# Altium schematic symbol library jlcpcb_2025_04_capacitors_extended_0402.schlib: 3594 symbols (part 20 of 20) (continued)
## V271K0402X7R500NBT (continued)
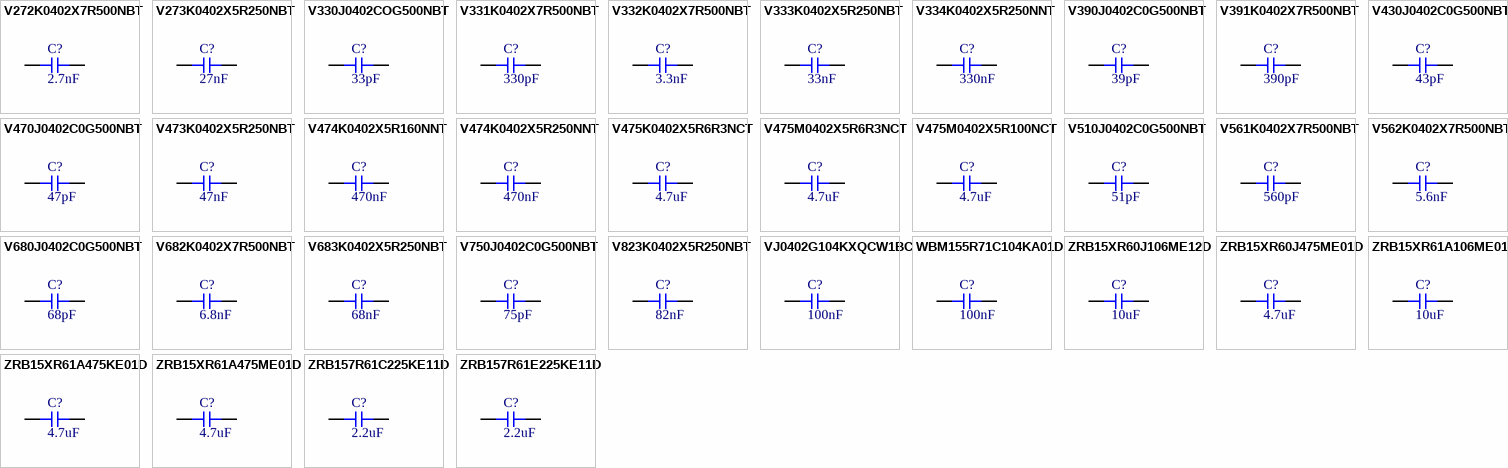
[diagram p89: symbols V272K0402X7R500NBT to ZRB157R61E225KE11D]

## V272K0402X7R500NBT
designator C?  Capacitance: 2.7nF  (hidden comment: *)
Capacitor, Ceramic (MLCC), 2.7nF, ±10%, 50V, X7R, ±10%, SMD 0402; Manufacturer: VIIYONG; Manufacturer Part Number: V272K0402X7R500NBT; Package Size: 0402; JLCPCB Basic Part: No; JLCPCB Part Number: C610176; Supplier 1: LCSC; Category: Capacitors - MLCC; Supplier Part Number 1: C610176; Tolerance: ±10%; Voltage Rating: 50V; Temperature Coefficient: X7R; RoHS: Yes; ComponentLink1Description: Datasheet; ComponentLink1URL: https://wmsc.lcsc.com/wmsc/upload/file/pdf/v2/lcsc/2304140030_VIIYONG-V272K0402X7R500NBT_C610176.pdf; ComponentLink2Description: JLCPCB Part URL; ComponentLink2URL: https://jlcpcb.com/partdetail/C610176; ComponentLink3Description: LCSC Part URL; ComponentLink3URL: https://lcsc.com/product-detail/Multilayer-Ceramic-Capacitors-MLCC---SMD-SMT_VIIYONG-VIIYONG-V272K0402X7R500NBT_C610176.html
footprint CAP-0402 (0402 (1005M) Capacitor)
pins: 1, 2

## V273K0402X5R250NBT
designator C?  Capacitance: 27nF  (hidden comment: *)
Capacitor, Ceramic (MLCC), 27nF, ±10%, 25V, X5R, ±10%, SMD 0402; Manufacturer: VIIYONG; Manufacturer Part Number: V273K0402X5R250NBT; Package Size: 0402; JLCPCB Basic Part: No; JLCPCB Part Number: C610195; Supplier 1: LCSC; Category: Capacitors - MLCC; Supplier Part Number 1: C610195; Tolerance: ±10%; Voltage Rating: 25V; Temperature Coefficient: X5R; RoHS: Yes; ComponentLink1Description: Datasheet; ComponentLink1URL: https://wmsc.lcsc.com/wmsc/upload/file/pdf/v2/lcsc/2304140030_VIIYONG-V273K0402X5R250NBT_C610195.pdf; ComponentLink2Description: JLCPCB Part URL; ComponentLink2URL: https://jlcpcb.com/partdetail/C610195; ComponentLink3Description: LCSC Part URL; ComponentLink3URL: https://lcsc.com/product-detail/Multilayer-Ceramic-Capacitors-MLCC---SMD-SMT_VIIYONG-VIIYONG-V273K0402X5R250NBT_C610195.html
footprint CAP-0402 (0402 (1005M) Capacitor)
pins: 1, 2

## V330J0402COG500NBT
designator C?  Capacitance: 33pF  (hidden comment: *)
Capacitor, Ceramic (MLCC), 33pF, ±5%, 50V, C0G, ±5%, SMD 0402; Manufacturer: VIIYONG; Manufacturer Part Number: V330J0402COG500NBT; Package Size: 0402; JLCPCB Basic Part: No; JLCPCB Part Number: C609878; Supplier 1: LCSC; Category: Capacitors - MLCC; Supplier Part Number 1: C609878; Tolerance: ±5%; Voltage Rating: 50V; Temperature Coefficient: C0G; RoHS: Yes; ComponentLink1Description: Datasheet; ComponentLink1URL: https://wmsc.lcsc.com/wmsc/upload/file/pdf/v2/lcsc/2304140030_VIIYONG-V330J0402COG500NBT_C609878.pdf; ComponentLink2Description: JLCPCB Part URL; ComponentLink2URL: https://jlcpcb.com/partdetail/C609878; ComponentLink3Description: LCSC Part URL; ComponentLink3URL: https://lcsc.com/product-detail/Multilayer-Ceramic-Capacitors-MLCC---SMD-SMT_VIIYONG-VIIYONG-V330J0402COG500NBT_C609878.html
footprint CAP-0402 (0402 (1005M) Capacitor)
pins: 1, 2

## V331K0402X7R500NBT
designator C?  Capacitance: 330pF  (hidden comment: *)
Capacitor, Ceramic (MLCC), 330pF, ±10%, 50V, X7R, ±10%, SMD 0402; Manufacturer: VIIYONG; Manufacturer Part Number: V331K0402X7R500NBT; Package Size: 0402; JLCPCB Basic Part: No; JLCPCB Part Number: C610163; Supplier 1: LCSC; Category: Capacitors - MLCC; Supplier Part Number 1: C610163; Tolerance: ±10%; Voltage Rating: 50V; Temperature Coefficient: X7R; RoHS: Yes; ComponentLink1Description: Datasheet; ComponentLink1URL: https://wmsc.lcsc.com/wmsc/upload/file/pdf/v2/lcsc/2304140030_VIIYONG-V331K0402X7R500NBT_C610163.pdf; ComponentLink2Description: JLCPCB Part URL; ComponentLink2URL: https://jlcpcb.com/partdetail/C610163; ComponentLink3Description: LCSC Part URL; ComponentLink3URL: https://lcsc.com/product-detail/Multilayer-Ceramic-Capacitors-MLCC---SMD-SMT_VIIYONG-VIIYONG-V331K0402X7R500NBT_C610163.html
footprint CAP-0402 (0402 (1005M) Capacitor)
pins: 1, 2

## V332K0402X7R500NBT
designator C?  Capacitance: 3.3nF  (hidden comment: *)
Capacitor, Ceramic (MLCC), 3.3nF, ±10%, 50V, X7R, ±10%, SMD 0402; Manufacturer: VIIYONG; Manufacturer Part Number: V332K0402X7R500NBT; Package Size: 0402; JLCPCB Basic Part: No; JLCPCB Part Number: C513448; Supplier 1: LCSC; Category: Capacitors - MLCC; Supplier Part Number 1: C513448; Tolerance: ±10%; Voltage Rating: 50V; Temperature Coefficient: X7R; RoHS: Yes; ComponentLink1Description: Datasheet; ComponentLink1URL: https://wmsc.lcsc.com/wmsc/upload/file/pdf/v2/lcsc/2304140030_VIIYONG-V332K0402X7R500NBT_C513448.pdf; ComponentLink2Description: JLCPCB Part URL; ComponentLink2URL: https://jlcpcb.com/partdetail/C513448; ComponentLink3Description: LCSC Part URL; ComponentLink3URL: https://lcsc.com/product-detail/Multilayer-Ceramic-Capacitors-MLCC---SMD-SMT_VIIYONG-VIIYONG-V332K0402X7R500NBT_C513448.html
footprint CAP-0402 (0402 (1005M) Capacitor)
pins: 1, 2

## V333K0402X5R250NBT
designator C?  Capacitance: 33nF  (hidden comment: *)
Capacitor, Ceramic (MLCC), 33nF, ±10%, 25V, X5R, ±10%, SMD 0402; Manufacturer: VIIYONG; Manufacturer Part Number: V333K0402X5R250NBT; Package Size: 0402; JLCPCB Basic Part: No; JLCPCB Part Number: C609897; Supplier 1: LCSC; Category: Capacitors - MLCC; Supplier Part Number 1: C609897; Tolerance: ±10%; Voltage Rating: 25V; Temperature Coefficient: X5R; RoHS: Yes; ComponentLink1Description: Datasheet; ComponentLink1URL: https://wmsc.lcsc.com/wmsc/upload/file/pdf/v2/lcsc/2304140030_VIIYONG-V333K0402X5R250NBT_C609897.pdf; ComponentLink2Description: JLCPCB Part URL; ComponentLink2URL: https://jlcpcb.com/partdetail/C609897; ComponentLink3Description: LCSC Part URL; ComponentLink3URL: https://lcsc.com/product-detail/Multilayer-Ceramic-Capacitors-MLCC---SMD-SMT_VIIYONG-VIIYONG-V333K0402X5R250NBT_C609897.html
footprint CAP-0402 (0402 (1005M) Capacitor)
pins: 1, 2

## V334K0402X5R250NNT
designator C?  Capacitance: 330nF  (hidden comment: *)
Capacitor, Ceramic (MLCC), 330nF, ±10%, 25V, X5R, ±10%, SMD 0402; Manufacturer: VIIYONG; Manufacturer Part Number: V334K0402X5R250NNT; Package Size: 0402; JLCPCB Basic Part: No; JLCPCB Part Number: C609906; Supplier 1: LCSC; Category: Capacitors - MLCC; Supplier Part Number 1: C609906; Tolerance: ±10%; Voltage Rating: 25V; Temperature Coefficient: X5R; RoHS: Yes; ComponentLink1Description: Datasheet; ComponentLink1URL: https://wmsc.lcsc.com/wmsc/upload/file/pdf/v2/lcsc/2304140030_VIIYONG-V334K0402X5R250NNT_C609906.pdf; ComponentLink2Description: JLCPCB Part URL; ComponentLink2URL: https://jlcpcb.com/partdetail/C609906; ComponentLink3Description: LCSC Part URL; ComponentLink3URL: https://lcsc.com/product-detail/Multilayer-Ceramic-Capacitors-MLCC---SMD-SMT_VIIYONG-VIIYONG-V334K0402X5R250NNT_C609906.html
footprint CAP-0402 (0402 (1005M) Capacitor)
pins: 1, 2

## V390J0402C0G500NBT
designator C?  Capacitance: 39pF  (hidden comment: *)
Capacitor, Ceramic (MLCC), 39pF, ±5%, 50V, C0G, ±5%, SMD 0402; Manufacturer: VIIYONG; Manufacturer Part Number: V390J0402C0G500NBT; Package Size: 0402; JLCPCB Basic Part: No; JLCPCB Part Number: C513450; Supplier 1: LCSC; Category: Capacitors - MLCC; Supplier Part Number 1: C513450; Tolerance: ±5%; Voltage Rating: 50V; Temperature Coefficient: C0G; RoHS: Yes; ComponentLink1Description: Datasheet; ComponentLink1URL: https://wmsc.lcsc.com/wmsc/upload/file/pdf/v2/lcsc/2304140030_VIIYONG-V390J0402C0G500NBT_C513450.pdf; ComponentLink2Description: JLCPCB Part URL; ComponentLink2URL: https://jlcpcb.com/partdetail/C513450; ComponentLink3Description: LCSC Part URL; ComponentLink3URL: https://lcsc.com/product-detail/Multilayer-Ceramic-Capacitors-MLCC---SMD-SMT_VIIYONG-VIIYONG-V390J0402C0G500NBT_C513450.html
footprint CAP-0402 (0402 (1005M) Capacitor)
pins: 1, 2

## V391K0402X7R500NBT
designator C?  Capacitance: 390pF  (hidden comment: *)
Capacitor, Ceramic (MLCC), 390pF, ±10%, 50V, X7R, ±10%, SMD 0402; Manufacturer: VIIYONG; Manufacturer Part Number: V391K0402X7R500NBT; Package Size: 0402; JLCPCB Basic Part: No; JLCPCB Part Number: C609909; Supplier 1: LCSC; Category: Capacitors - MLCC; Supplier Part Number 1: C609909; Tolerance: ±10%; Voltage Rating: 50V; Temperature Coefficient: X7R; RoHS: Yes; ComponentLink1Description: Datasheet; ComponentLink1URL: https://wmsc.lcsc.com/wmsc/upload/file/pdf/v2/lcsc/2304140030_VIIYONG-V391K0402X7R500NBT_C609909.pdf; ComponentLink2Description: JLCPCB Part URL; ComponentLink2URL: https://jlcpcb.com/partdetail/C609909; ComponentLink3Description: LCSC Part URL; ComponentLink3URL: https://lcsc.com/product-detail/Multilayer-Ceramic-Capacitors-MLCC---SMD-SMT_VIIYONG-VIIYONG-V391K0402X7R500NBT_C609909.html
footprint CAP-0402 (0402 (1005M) Capacitor)
pins: 1, 2

## V430J0402C0G500NBT
designator C?  Capacitance: 43pF  (hidden comment: *)
Capacitor, Ceramic (MLCC), 43pF, ±5%, 50V, C0G, ±5%, SMD 0402; Manufacturer: VIIYONG; Manufacturer Part Number: V430J0402C0G500NBT; Package Size: 0402; JLCPCB Basic Part: No; JLCPCB Part Number: C610131; Supplier 1: LCSC; Category: Capacitors - MLCC; Supplier Part Number 1: C610131; Tolerance: ±5%; Voltage Rating: 50V; Temperature Coefficient: C0G; RoHS: Yes; ComponentLink1Description: Datasheet; ComponentLink1URL: https://wmsc.lcsc.com/wmsc/upload/file/pdf/v2/lcsc/2304140030_VIIYONG-V430J0402C0G500NBT_C610131.pdf; ComponentLink2Description: JLCPCB Part URL; ComponentLink2URL: https://jlcpcb.com/partdetail/C610131; ComponentLink3Description: LCSC Part URL; ComponentLink3URL: https://lcsc.com/product-detail/Multilayer-Ceramic-Capacitors-MLCC---SMD-SMT_VIIYONG-VIIYONG-V430J0402C0G500NBT_C610131.html
footprint CAP-0402 (0402 (1005M) Capacitor)
pins: 1, 2

## V470J0402C0G500NBT
designator C?  Capacitance: 47pF  (hidden comment: *)
Capacitor, Ceramic (MLCC), 47pF, ±5%, 50V, C0G, ±5%, SMD 0402; Manufacturer: VIIYONG; Manufacturer Part Number: V470J0402C0G500NBT; Package Size: 0402; JLCPCB Basic Part: No; JLCPCB Part Number: C609887; Supplier 1: LCSC; Category: Capacitors - MLCC; Supplier Part Number 1: C609887; Tolerance: ±5%; Voltage Rating: 50V; Temperature Coefficient: C0G; RoHS: Yes; ComponentLink1Description: Datasheet; ComponentLink1URL: https://wmsc.lcsc.com/wmsc/upload/file/pdf/v2/lcsc/2304140030_VIIYONG-V470J0402C0G500NBT_C609887.pdf; ComponentLink2Description: JLCPCB Part URL; ComponentLink2URL: https://jlcpcb.com/partdetail/C609887; ComponentLink3Description: LCSC Part URL; ComponentLink3URL: https://lcsc.com/product-detail/Multilayer-Ceramic-Capacitors-MLCC---SMD-SMT_VIIYONG-VIIYONG-V470J0402COG500NBT_C609887.html
footprint CAP-0402 (0402 (1005M) Capacitor)
pins: 1, 2

## V473K0402X5R250NBT
designator C?  Capacitance: 47nF  (hidden comment: *)
Capacitor, Ceramic (MLCC), 47nF, ±10%, 25V, X5R, ±10%, SMD 0402; Manufacturer: VIIYONG; Manufacturer Part Number: V473K0402X5R250NBT; Package Size: 0402; JLCPCB Basic Part: No; JLCPCB Part Number: C609901; Supplier 1: LCSC; Category: Capacitors - MLCC; Supplier Part Number 1: C609901; Tolerance: ±10%; Voltage Rating: 25V; Temperature Coefficient: X5R; RoHS: Yes; ComponentLink1Description: Datasheet; ComponentLink1URL: https://wmsc.lcsc.com/wmsc/upload/file/pdf/v2/lcsc/2304140030_VIIYONG-V473K0402X5R250NBT_C609901.pdf; ComponentLink2Description: JLCPCB Part URL; ComponentLink2URL: https://jlcpcb.com/partdetail/C609901; ComponentLink3Description: LCSC Part URL; ComponentLink3URL: https://lcsc.com/product-detail/Multilayer-Ceramic-Capacitors-MLCC---SMD-SMT_VIIYONG-VIIYONG-V473K0402X5R250NBT_C609901.html
footprint CAP-0402 (0402 (1005M) Capacitor)
pins: 1, 2

## V474K0402X5R160NNT
designator C?  Capacitance: 470nF  (hidden comment: *)
Capacitor, Ceramic (MLCC), 470nF, ±10%, 16V, ±10%, SMD 0402; Manufacturer: VIIYONG; Manufacturer Part Number: V474K0402X5R160NNT; Package Size: 0402; JLCPCB Basic Part: No; JLCPCB Part Number: C962114; Supplier 1: LCSC; Category: Capacitors - MLCC; Supplier Part Number 1: C962114; Tolerance: ±10%; Voltage Rating: 16V; RoHS: Yes; ComponentLink1Description: Datasheet; ComponentLink1URL: https://wmsc.lcsc.com/wmsc/upload/file/pdf/v2/lcsc/2304140030_VIIYONG-V474K0402X5R160NNT_C962114.pdf; ComponentLink2Description: JLCPCB Part URL; ComponentLink2URL: https://jlcpcb.com/partdetail/C962114; ComponentLink3Description: LCSC Part URL; ComponentLink3URL: https://lcsc.com/product-detail/Multilayer-Ceramic-Capacitors-MLCC---SMD-SMT_VIIYONG-VIIYONG-V474K0402X5R160NNT_C962114.html
footprint CAP-0402 (0402 (1005M) Capacitor)
pins: 1, 2

## V474K0402X5R250NNT
designator C?  Capacitance: 470nF  (hidden comment: *)
Capacitor, Ceramic (MLCC), 470nF, ±10%, 25V, ±10%, SMD 0402; Manufacturer: VIIYONG; Manufacturer Part Number: V474K0402X5R250NNT; Package Size: 0402; JLCPCB Basic Part: No; JLCPCB Part Number: C962115; Supplier 1: LCSC; Category: Capacitors - MLCC; Supplier Part Number 1: C962115; Tolerance: ±10%; Voltage Rating: 25V; RoHS: Yes; ComponentLink1Description: Datasheet; ComponentLink1URL: https://wmsc.lcsc.com/wmsc/upload/file/pdf/v2/lcsc/2012102315_VIIYONG-V474K0402X5R250NNT_C962115.pdf; ComponentLink2Description: JLCPCB Part URL; ComponentLink2URL: https://jlcpcb.com/partdetail/C962115; ComponentLink3Description: LCSC Part URL; ComponentLink3URL: https://lcsc.com/product-detail/Multilayer-Ceramic-Capacitors-MLCC---SMD-SMT_VIIYONG-VIIYONG-V474K0402X5R250NNT_C962115.html
footprint CAP-0402 (0402 (1005M) Capacitor)
pins: 1, 2

## V475K0402X5R6R3NCT
designator C?  Capacitance: 4.7uF  (hidden comment: *)
Capacitor, Ceramic (MLCC), 4.7uF, 6.3V, X5R, SMD 0402; Manufacturer: VIIYONG; Manufacturer Part Number: V475K0402X5R6R3NCT; Package Size: 0402; JLCPCB Basic Part: No; JLCPCB Part Number: C2980394; Supplier 1: LCSC; Category: Capacitors - MLCC; Supplier Part Number 1: C2980394; Voltage Rating: 6.3V; Temperature Coefficient: X5R; RoHS: Yes; ComponentLink1Description: Datasheet; ComponentLink1URL: https://wmsc.lcsc.com/wmsc/upload/file/pdf/v2/lcsc/2203041530_VIIYONG-V475K0402X5R6R3NCT_C2980394.pdf; ComponentLink2Description: JLCPCB Part URL; ComponentLink2URL: https://jlcpcb.com/partdetail/C2980394; ComponentLink3Description: LCSC Part URL; ComponentLink3URL: https://lcsc.com/product-detail/Multilayer-Ceramic-Capacitors-MLCC---SMD-SMT_VIIYONG-VIIYONG-V475K0402X5R6R3NCT_C2980394.html
footprint CAP-0402 (0402 (1005M) Capacitor)
pins: 1, 2

## V475M0402X5R6R3NCT
designator C?  Capacitance: 4.7uF  (hidden comment: *)
Capacitor, Ceramic (MLCC), 4.7uF, ±20%, 6.3V, X5R, ±20%, SMD 0402; Manufacturer: VIIYONG; Manufacturer Part Number: V475M0402X5R6R3NCT; Package Size: 0402; JLCPCB Basic Part: No; JLCPCB Part Number: C2980397; Supplier 1: LCSC; Category: Capacitors - MLCC; Supplier Part Number 1: C2980397; Tolerance: ±20%; Voltage Rating: 6.3V; Temperature Coefficient: X5R; RoHS: Yes; ComponentLink1Description: Datasheet; ComponentLink1URL: https://wmsc.lcsc.com/wmsc/upload/file/pdf/v2/lcsc/2203041530_VIIYONG-V475M0402X5R6R3NCT_C2980397.pdf; ComponentLink2Description: JLCPCB Part URL; ComponentLink2URL: https://jlcpcb.com/partdetail/C2980397; ComponentLink3Description: LCSC Part URL; ComponentLink3URL: https://lcsc.com/product-detail/Multilayer-Ceramic-Capacitors-MLCC---SMD-SMT_VIIYONG-VIIYONG-V475M0402X5R6R3NCT_C2980397.html
footprint CAP-0402 (0402 (1005M) Capacitor)
pins: 1, 2

## V475M0402X5R100NCT
designator C?  Capacitance: 4.7uF  (hidden comment: *)
Capacitor, Ceramic (MLCC), 4.7uF, ±20%, 10V, ±20%, SMD 0402; Manufacturer: VIIYONG; Manufacturer Part Number: V475M0402X5R100NCT; Package Size: 0402; JLCPCB Basic Part: No; JLCPCB Part Number: C2691404; Supplier 1: LCSC; Category: Capacitors - MLCC; Supplier Part Number 1: C2691404; Tolerance: ±20%; Voltage Rating: 10V; RoHS: Yes; ComponentLink1Description: Datasheet; ComponentLink1URL: https://wmsc.lcsc.com/wmsc/upload/file/pdf/v2/lcsc/2304140030_VIIYONG-V475M0402X5R100NCT_C2691404.pdf; ComponentLink2Description: JLCPCB Part URL; ComponentLink2URL: https://jlcpcb.com/partdetail/C2691404; ComponentLink3Description: LCSC Part URL; ComponentLink3URL: https://lcsc.com/product-detail/Multilayer-Ceramic-Capacitors-MLCC---SMD-SMT_VIIYONG-VIIYONG-V475M0402X5R100NCT_C2691404.html
footprint CAP-0402 (0402 (1005M) Capacitor)
pins: 1, 2

## V510J0402C0G500NBT
designator C?  Capacitance: 51pF  (hidden comment: *)
Capacitor, Ceramic (MLCC), 51pF, ±5%, 50V, C0G, ±5%, SMD 0402; Manufacturer: VIIYONG; Manufacturer Part Number: V510J0402C0G500NBT; Package Size: 0402; JLCPCB Basic Part: No; JLCPCB Part Number: C610134; Supplier 1: LCSC; Category: Capacitors - MLCC; Supplier Part Number 1: C610134; Tolerance: ±5%; Voltage Rating: 50V; Temperature Coefficient: C0G; RoHS: Yes; ComponentLink1Description: Datasheet; ComponentLink1URL: https://wmsc.lcsc.com/wmsc/upload/file/pdf/v2/lcsc/2304140030_VIIYONG-V510J0402C0G500NBT_C610134.pdf; ComponentLink2Description: JLCPCB Part URL; ComponentLink2URL: https://jlcpcb.com/partdetail/C610134; ComponentLink3Description: LCSC Part URL; ComponentLink3URL: https://lcsc.com/product-detail/Multilayer-Ceramic-Capacitors-MLCC---SMD-SMT_VIIYONG-VIIYONG-V510J0402C0G500NBT_C610134.html
footprint CAP-0402 (0402 (1005M) Capacitor)
pins: 1, 2

## V561K0402X7R500NBT
designator C?  Capacitance: 560pF  (hidden comment: *)
Capacitor, Ceramic (MLCC), 560pF, ±10%, 50V, X7R, ±10%, SMD 0402; Manufacturer: VIIYONG; Manufacturer Part Number: V561K0402X7R500NBT; Package Size: 0402; JLCPCB Basic Part: No; JLCPCB Part Number: C513453; Supplier 1: LCSC; Category: Capacitors - MLCC; Supplier Part Number 1: C513453; Tolerance: ±10%; Voltage Rating: 50V; Temperature Coefficient: X7R; RoHS: Yes; ComponentLink1Description: Datasheet; ComponentLink1URL: https://wmsc.lcsc.com/wmsc/upload/file/pdf/v2/lcsc/2304140030_VIIYONG-V561K0402X7R500NBT_C513453.pdf; ComponentLink2Description: JLCPCB Part URL; ComponentLink2URL: https://jlcpcb.com/partdetail/C513453; ComponentLink3Description: LCSC Part URL; ComponentLink3URL: https://lcsc.com/product-detail/Multilayer-Ceramic-Capacitors-MLCC---SMD-SMT_VIIYONG-VIIYONG-V561K0402X7R500NBT_C513453.html
footprint CAP-0402 (0402 (1005M) Capacitor)
pins: 1, 2

## V562K0402X7R500NBT
designator C?  Capacitance: 5.6nF  (hidden comment: *)
Capacitor, Ceramic (MLCC), 5.6nF, ±10%, 50V, X7R, ±10%, SMD 0402; Manufacturer: VIIYONG; Manufacturer Part Number: V562K0402X7R500NBT; Package Size: 0402; JLCPCB Basic Part: No; JLCPCB Part Number: C610180; Supplier 1: LCSC; Category: Capacitors - MLCC; Supplier Part Number 1: C610180; Tolerance: ±10%; Voltage Rating: 50V; Temperature Coefficient: X7R; RoHS: Yes; ComponentLink1Description: Datasheet; ComponentLink1URL: https://wmsc.lcsc.com/wmsc/upload/file/pdf/v2/lcsc/2304140030_VIIYONG-V562K0402X7R500NBT_C610180.pdf; ComponentLink2Description: JLCPCB Part URL; ComponentLink2URL: https://jlcpcb.com/partdetail/C610180; ComponentLink3Description: LCSC Part URL; ComponentLink3URL: https://lcsc.com/product-detail/Multilayer-Ceramic-Capacitors-MLCC---SMD-SMT_VIIYONG-VIIYONG-V562K0402X7R500NBT_C610180.html
footprint CAP-0402 (0402 (1005M) Capacitor)
pins: 1, 2

## V680J0402C0G500NBT
designator C?  Capacitance: 68pF  (hidden comment: *)
Capacitor, Ceramic (MLCC), 68pF, ±5%, 50V, C0G, ±5%, SMD 0402; Manufacturer: VIIYONG; Manufacturer Part Number: V680J0402C0G500NBT; Package Size: 0402; JLCPCB Basic Part: No; JLCPCB Part Number: C513454; Supplier 1: LCSC; Category: Capacitors - MLCC; Supplier Part Number 1: C513454; Tolerance: ±5%; Voltage Rating: 50V; Temperature Coefficient: C0G; RoHS: Yes; ComponentLink1Description: Datasheet; ComponentLink1URL: https://wmsc.lcsc.com/wmsc/upload/file/pdf/v2/lcsc/2304140030_VIIYONG-V680J0402C0G500NBT_C513454.pdf; ComponentLink2Description: JLCPCB Part URL; ComponentLink2URL: https://jlcpcb.com/partdetail/C513454; ComponentLink3Description: LCSC Part URL; ComponentLink3URL: https://lcsc.com/product-detail/Multilayer-Ceramic-Capacitors-MLCC---SMD-SMT_VIIYONG-VIIYONG-V680J0402C0G500NBT_C513454.html
footprint CAP-0402 (0402 (1005M) Capacitor)
pins: 1, 2

## V682K0402X7R500NBT
designator C?  Capacitance: 6.8nF  (hidden comment: *)
Capacitor, Ceramic (MLCC), 6.8nF, ±10%, 50V, X7R, ±10%, SMD 0402; Manufacturer: VIIYONG; Manufacturer Part Number: V682K0402X7R500NBT; Package Size: 0402; JLCPCB Basic Part: No; JLCPCB Part Number: C610181; Supplier 1: LCSC; Category: Capacitors - MLCC; Supplier Part Number 1: C610181; Tolerance: ±10%; Voltage Rating: 50V; Temperature Coefficient: X7R; RoHS: Yes; ComponentLink1Description: Datasheet; ComponentLink1URL: https://wmsc.lcsc.com/wmsc/upload/file/pdf/v2/lcsc/2304140030_VIIYONG-V682K0402X7R500NBT_C610181.pdf; ComponentLink2Description: JLCPCB Part URL; ComponentLink2URL: https://jlcpcb.com/partdetail/C610181; ComponentLink3Description: LCSC Part URL; ComponentLink3URL: https://lcsc.com/product-detail/Multilayer-Ceramic-Capacitors-MLCC---SMD-SMT_VIIYONG-VIIYONG-V682K0402X7R500NBT_C610181.html
footprint CAP-0402 (0402 (1005M) Capacitor)
pins: 1, 2

## V683K0402X5R250NBT
designator C?  Capacitance: 68nF  (hidden comment: *)
Capacitor, Ceramic (MLCC), 68nF, ±10%, 25V, X5R, ±10%, SMD 0402; Manufacturer: VIIYONG; Manufacturer Part Number: V683K0402X5R250NBT; Package Size: 0402; JLCPCB Basic Part: No; JLCPCB Part Number: C610201; Supplier 1: LCSC; Category: Capacitors - MLCC; Supplier Part Number 1: C610201; Tolerance: ±10%; Voltage Rating: 25V; Temperature Coefficient: X5R; RoHS: Yes; ComponentLink1Description: Datasheet; ComponentLink1URL: https://wmsc.lcsc.com/wmsc/upload/file/pdf/v2/lcsc/2304140030_VIIYONG-V683K0402X5R250NBT_C610201.pdf; ComponentLink2Description: JLCPCB Part URL; ComponentLink2URL: https://jlcpcb.com/partdetail/C610201; ComponentLink3Description: LCSC Part URL; ComponentLink3URL: https://lcsc.com/product-detail/Multilayer-Ceramic-Capacitors-MLCC---SMD-SMT_VIIYONG-VIIYONG-V683K0402X5R250NBT_C610201.html
footprint CAP-0402 (0402 (1005M) Capacitor)
pins: 1, 2

## V750J0402C0G500NBT
designator C?  Capacitance: 75pF  (hidden comment: *)
Capacitor, Ceramic (MLCC), 75pF, ±5%, 50V, C0G, ±5%, SMD 0402; Manufacturer: VIIYONG; Manufacturer Part Number: V750J0402C0G500NBT; Package Size: 0402; JLCPCB Basic Part: No; JLCPCB Part Number: C610139; Supplier 1: LCSC; Category: Capacitors - MLCC; Supplier Part Number 1: C610139; Tolerance: ±5%; Voltage Rating: 50V; Temperature Coefficient: C0G; RoHS: Yes; ComponentLink1Description: Datasheet; ComponentLink1URL: https://wmsc.lcsc.com/wmsc/upload/file/pdf/v2/lcsc/2304140030_VIIYONG-V750J0402C0G500NBT_C610139.pdf; ComponentLink2Description: JLCPCB Part URL; ComponentLink2URL: https://jlcpcb.com/partdetail/C610139; ComponentLink3Description: LCSC Part URL; ComponentLink3URL: https://lcsc.com/product-detail/Multilayer-Ceramic-Capacitors-MLCC---SMD-SMT_VIIYONG-VIIYONG-V750J0402C0G500NBT_C610139.html
footprint CAP-0402 (0402 (1005M) Capacitor)
pins: 1, 2

## V823K0402X5R250NBT
designator C?  Capacitance: 82nF  (hidden comment: *)
Capacitor, Ceramic (MLCC), 82nF, ±10%, 25V, X5R, ±10%, SMD 0402; Manufacturer: VIIYONG; Manufacturer Part Number: V823K0402X5R250NBT; Package Size: 0402; JLCPCB Basic Part: No; JLCPCB Part Number: C610203; Supplier 1: LCSC; Category: Capacitors - MLCC; Supplier Part Number 1: C610203; Tolerance: ±10%; Voltage Rating: 25V; Temperature Coefficient: X5R; RoHS: Yes; ComponentLink1Description: Datasheet; ComponentLink1URL: https://wmsc.lcsc.com/wmsc/upload/file/pdf/v2/lcsc/2304140030_VIIYONG-V823K0402X5R250NBT_C610203.pdf; ComponentLink2Description: JLCPCB Part URL; ComponentLink2URL: https://jlcpcb.com/partdetail/C610203; ComponentLink3Description: LCSC Part URL; ComponentLink3URL: https://lcsc.com/product-detail/Multilayer-Ceramic-Capacitors-MLCC---SMD-SMT_VIIYONG-VIIYONG-V823K0402X5R250NBT_C610203.html
footprint CAP-0402 (0402 (1005M) Capacitor)
pins: 1, 2

## VJ0402G104KXQCW1BC
designator C?  Capacitance: 100nF  (hidden comment: *)
Capacitor, Ceramic (MLCC), 100nF, ±10%, 10V, X5R, ±10%, SMD 0402; Manufacturer: Vishay Intertech; Manufacturer Part Number: VJ0402G104KXQCW1BC; Package Size: 0402; JLCPCB Basic Part: No; JLCPCB Part Number: C169292; Supplier 1: LCSC; Category: Capacitors - MLCC; Supplier Part Number 1: C169292; Tolerance: ±10%; Voltage Rating: 10V; Temperature Coefficient: X5R; RoHS: Yes; ComponentLink1Description: Datasheet; ComponentLink1URL: https://wmsc.lcsc.com/wmsc/upload/file/pdf/v2/lcsc/1809301915_Vishay-Intertech-VJ0402G104KXQCW1BC_C169292.pdf; ComponentLink2Description: JLCPCB Part URL; ComponentLink2URL: https://jlcpcb.com/partdetail/C169292; ComponentLink3Description: LCSC Part URL; ComponentLink3URL: https://lcsc.com/product-detail/Multilayer-Ceramic-Capacitors-MLCC---SMD-SMT_Vishay-Intertech-Vishay-Intertech-VJ0402G104KXQCW1BC_C169292.html
footprint CAP-0402 (0402 (1005M) Capacitor)
pins: 1, 2

## WBM155R71C104KA01D
designator C?  Capacitance: 100nF  (hidden comment: *)
Capacitor, Ceramic (MLCC), 100nF, ±10%, ±10%, SMD 0402; Manufacturer: Murata Electronics; Manufacturer Part Number: WBM155R71C104KA01D; Package Size: 0402; JLCPCB Basic Part: No; JLCPCB Part Number: C77223; Supplier 1: LCSC; Category: Capacitors - MLCC; Supplier Part Number 1: C77223; Tolerance: ±10%; RoHS: Yes; ComponentLink1Description: Datasheet; ComponentLink2Description: JLCPCB Part URL; ComponentLink2URL: https://jlcpcb.com/partdetail/C77223; ComponentLink3Description: LCSC Part URL; ComponentLink3URL: https://lcsc.com/product-detail/Multilayer-Ceramic-Capacitors-MLCC---SMD-SMT_Murata-Electronics-Murata-Electronics-WBM155R71C104KA01D_C77223.html
footprint CAP-0402 (0402 (1005M) Capacitor)
pins: 1, 2

## ZRB15XR60J106ME12D
designator C?  Capacitance: 10uF  (hidden comment: *)
Capacitor, Ceramic (MLCC), 10uF, ±20%, 6.3V, X5R, ±20%, SMD 0402; Manufacturer: Murata Electronics; Manufacturer Part Number: ZRB15XR60J106ME12D; Package Size: 0402; JLCPCB Basic Part: No; JLCPCB Part Number: C703695; Supplier 1: LCSC; Category: Capacitors - MLCC; Supplier Part Number 1: C703695; Tolerance: ±20%; Voltage Rating: 6.3V; Temperature Coefficient: X5R; RoHS: Yes; ComponentLink1Description: Datasheet; ComponentLink1URL: https://wmsc.lcsc.com/wmsc/upload/file/pdf/v2/lcsc/2010302039_Murata-Electronics-ZRB15XR60J106ME12D_C703695.pdf; ComponentLink2Description: JLCPCB Part URL; ComponentLink2URL: https://jlcpcb.com/partdetail/C703695; ComponentLink3Description: LCSC Part URL; ComponentLink3URL: https://lcsc.com/product-detail/Multilayer-Ceramic-Capacitors-MLCC---SMD-SMT_Murata-Electronics-Murata-Electronics-ZRB15XR60J106ME12D_C703695.html
footprint CAP-0402 (0402 (1005M) Capacitor)
pins: 1, 2

## ZRB15XR60J475ME01D
designator C?  Capacitance: 4.7uF  (hidden comment: *)
Capacitor, Ceramic (MLCC), 4.7uF, ±20%, 6.3V, X5R, ±20%, SMD 0402; Manufacturer: Murata Electronics; Manufacturer Part Number: ZRB15XR60J475ME01D; Package Size: 0402; JLCPCB Basic Part: No; JLCPCB Part Number: C909843; Supplier 1: LCSC; Category: Capacitors - MLCC; Supplier Part Number 1: C909843; Tolerance: ±20%; Voltage Rating: 6.3V; Temperature Coefficient: X5R; RoHS: Yes; ComponentLink1Description: Datasheet; ComponentLink1URL: https://wmsc.lcsc.com/wmsc/upload/file/pdf/v2/lcsc/2012081135_Murata-Electronics-ZRB15XR60J475ME01D_C909843.pdf; ComponentLink2Description: JLCPCB Part URL; ComponentLink2URL: https://jlcpcb.com/partdetail/C909843; ComponentLink3Description: LCSC Part URL; ComponentLink3URL: https://lcsc.com/product-detail/Multilayer-Ceramic-Capacitors-MLCC---SMD-SMT_Murata-Electronics-Murata-Electronics-ZRB15XR60J475ME01D_C909843.html
footprint CAP-0402 (0402 (1005M) Capacitor)
pins: 1, 2

## ZRB15XR61A106ME01D
designator C?  Capacitance: 10uF  (hidden comment: *)
Capacitor, Ceramic (MLCC), 10uF, ±20%, 10V, X5R, ±20%, SMD 0402; Manufacturer: Murata Electronics; Manufacturer Part Number: ZRB15XR61A106ME01D; Package Size: 0402; JLCPCB Basic Part: No; JLCPCB Part Number: C527590; Supplier 1: LCSC; Category: Capacitors - MLCC; Supplier Part Number 1: C527590; Tolerance: ±20%; Voltage Rating: 10V; Temperature Coefficient: X5R; RoHS: Yes; ComponentLink1Description: Datasheet; ComponentLink1URL: https://wmsc.lcsc.com/wmsc/upload/file/pdf/v2/lcsc/2010051233_Murata-Electronics-ZRB15XR61A106ME01D_C527590.pdf; ComponentLink2Description: JLCPCB Part URL; ComponentLink2URL: https://jlcpcb.com/partdetail/C527590; ComponentLink3Description: LCSC Part URL; ComponentLink3URL: https://lcsc.com/product-detail/Multilayer-Ceramic-Capacitors-MLCC---SMD-SMT_Murata-Electronics-Murata-Electronics-ZRB15XR61A106ME01D_C527590.html
footprint CAP-0402 (0402 (1005M) Capacitor)
pins: 1, 2

## ZRB15XR61A475KE01D
designator C?  Capacitance: 4.7uF  (hidden comment: *)
Capacitor, Ceramic (MLCC), 4.7uF, ±10%, 10V, X5R, ±10%, SMD 0402; Manufacturer: Murata Electronics; Manufacturer Part Number: ZRB15XR61A475KE01D; Package Size: 0402; JLCPCB Basic Part: No; JLCPCB Part Number: C703694; Supplier 1: LCSC; Category: Capacitors - MLCC; Supplier Part Number 1: C703694; Tolerance: ±10%; Voltage Rating: 10V; Temperature Coefficient: X5R; RoHS: Yes; ComponentLink1Description: Datasheet; ComponentLink1URL: https://wmsc.lcsc.com/wmsc/upload/file/pdf/v2/lcsc/2008101235_Murata-Electronics-ZRB15XR61A475KE01D_C703694.pdf; ComponentLink2Description: JLCPCB Part URL; ComponentLink2URL: https://jlcpcb.com/partdetail/C703694; ComponentLink3Description: LCSC Part URL; ComponentLink3URL: https://lcsc.com/product-detail/Multilayer-Ceramic-Capacitors-MLCC---SMD-SMT_Murata-Electronics-Murata-Electronics-ZRB15XR61A475KE01D_C703694.html
footprint CAP-0402 (0402 (1005M) Capacitor)
pins: 1, 2

## ZRB15XR61A475ME01D
designator C?  Capacitance: 4.7uF  (hidden comment: *)
Capacitor, Ceramic (MLCC), 4.7uF, ±20%, 10V, X5R, ±20%, SMD 0402; Manufacturer: Murata Electronics; Manufacturer Part Number: ZRB15XR61A475ME01D; Package Size: 0402; JLCPCB Basic Part: No; JLCPCB Part Number: C237602; Supplier 1: LCSC; Category: Capacitors - MLCC; Supplier Part Number 1: C237602; Tolerance: ±20%; Voltage Rating: 10V; Temperature Coefficient: X5R; RoHS: Yes; ComponentLink1Description: Datasheet; ComponentLink1URL: https://wmsc.lcsc.com/wmsc/upload/file/pdf/v2/lcsc/2111120930_Murata-Electronics-ZRB15XR61A475ME01D_C237602.pdf; ComponentLink2Description: JLCPCB Part URL; ComponentLink2URL: https://jlcpcb.com/partdetail/C237602; ComponentLink3Description: LCSC Part URL; ComponentLink3URL: https://lcsc.com/product-detail/Multilayer-Ceramic-Capacitors-MLCC---SMD-SMT_Murata-Electronics-Murata-Electronics-ZRB15XR61A475ME01D_C237602.html
footprint CAP-0402 (0402 (1005M) Capacitor)
pins: 1, 2

## ZRB157R61C225KE11D
designator C?  Capacitance: 2.2uF  (hidden comment: *)
Capacitor, Ceramic (MLCC), 2.2uF, ±10%, 16V, X5R, ±10%, SMD 0402; Manufacturer: Murata Electronics; Manufacturer Part Number: ZRB157R61C225KE11D; Package Size: 0402; JLCPCB Basic Part: No; JLCPCB Part Number: C703697; Supplier 1: LCSC; Category: Capacitors - MLCC; Supplier Part Number 1: C703697; Tolerance: ±10%; Voltage Rating: 16V; Temperature Coefficient: X5R; RoHS: Yes; ComponentLink1Description: Datasheet; ComponentLink1URL: https://wmsc.lcsc.com/wmsc/upload/file/pdf/v2/lcsc/2009261435_Murata-Electronics-ZRB157R61C225KE11D_C703697.pdf; ComponentLink2Description: JLCPCB Part URL; ComponentLink2URL: https://jlcpcb.com/partdetail/C703697; ComponentLink3Description: LCSC Part URL; ComponentLink3URL: https://lcsc.com/product-detail/Multilayer-Ceramic-Capacitors-MLCC---SMD-SMT_Murata-Electronics-Murata-Electronics-ZRB157R61C225KE11D_C703697.html
footprint CAP-0402 (0402 (1005M) Capacitor)
pins: 1, 2

## ZRB157R61E225KE11D
designator C?  Capacitance: 2.2uF  (hidden comment: *)
Capacitor, Ceramic (MLCC), 2.2uF, ±10%, 25V, X5R, ±10%, SMD 0402; Manufacturer: Murata Electronics; Manufacturer Part Number: ZRB157R61E225KE11D; Package Size: 0402; JLCPCB Basic Part: No; JLCPCB Part Number: C703696; Supplier 1: LCSC; Category: Capacitors - MLCC; Supplier Part Number 1: C703696; Tolerance: ±10%; Voltage Rating: 25V; Temperature Coefficient: X5R; RoHS: Yes; ComponentLink1Description: Datasheet; ComponentLink1URL: https://wmsc.lcsc.com/wmsc/upload/file/pdf/v2/lcsc/2009261435_Murata-Electronics-ZRB157R61E225KE11D_C703696.pdf; ComponentLink2Description: JLCPCB Part URL; ComponentLink2URL: https://jlcpcb.com/partdetail/C703696; ComponentLink3Description: LCSC Part URL; ComponentLink3URL: https://lcsc.com/product-detail/Multilayer-Ceramic-Capacitors-MLCC---SMD-SMT_Murata-Electronics-Murata-Electronics-ZRB157R61E225KE11D_C703696.html
footprint CAP-0402 (0402 (1005M) Capacitor)
pins: 1, 2